# Altium footprint library 集成IC.PcbLib: 49 footprints (part 2 of 4)
Each footprint in its own frame and in the unit in brackets; x right, y up, seen from the top. Pads: shape width x height; smd on the part's side, far side on the other; paste and mask are expansions set on the pad; w line width, h text height; cw(c..) or ccw(c..) is an arc to the next point about the centre after c.
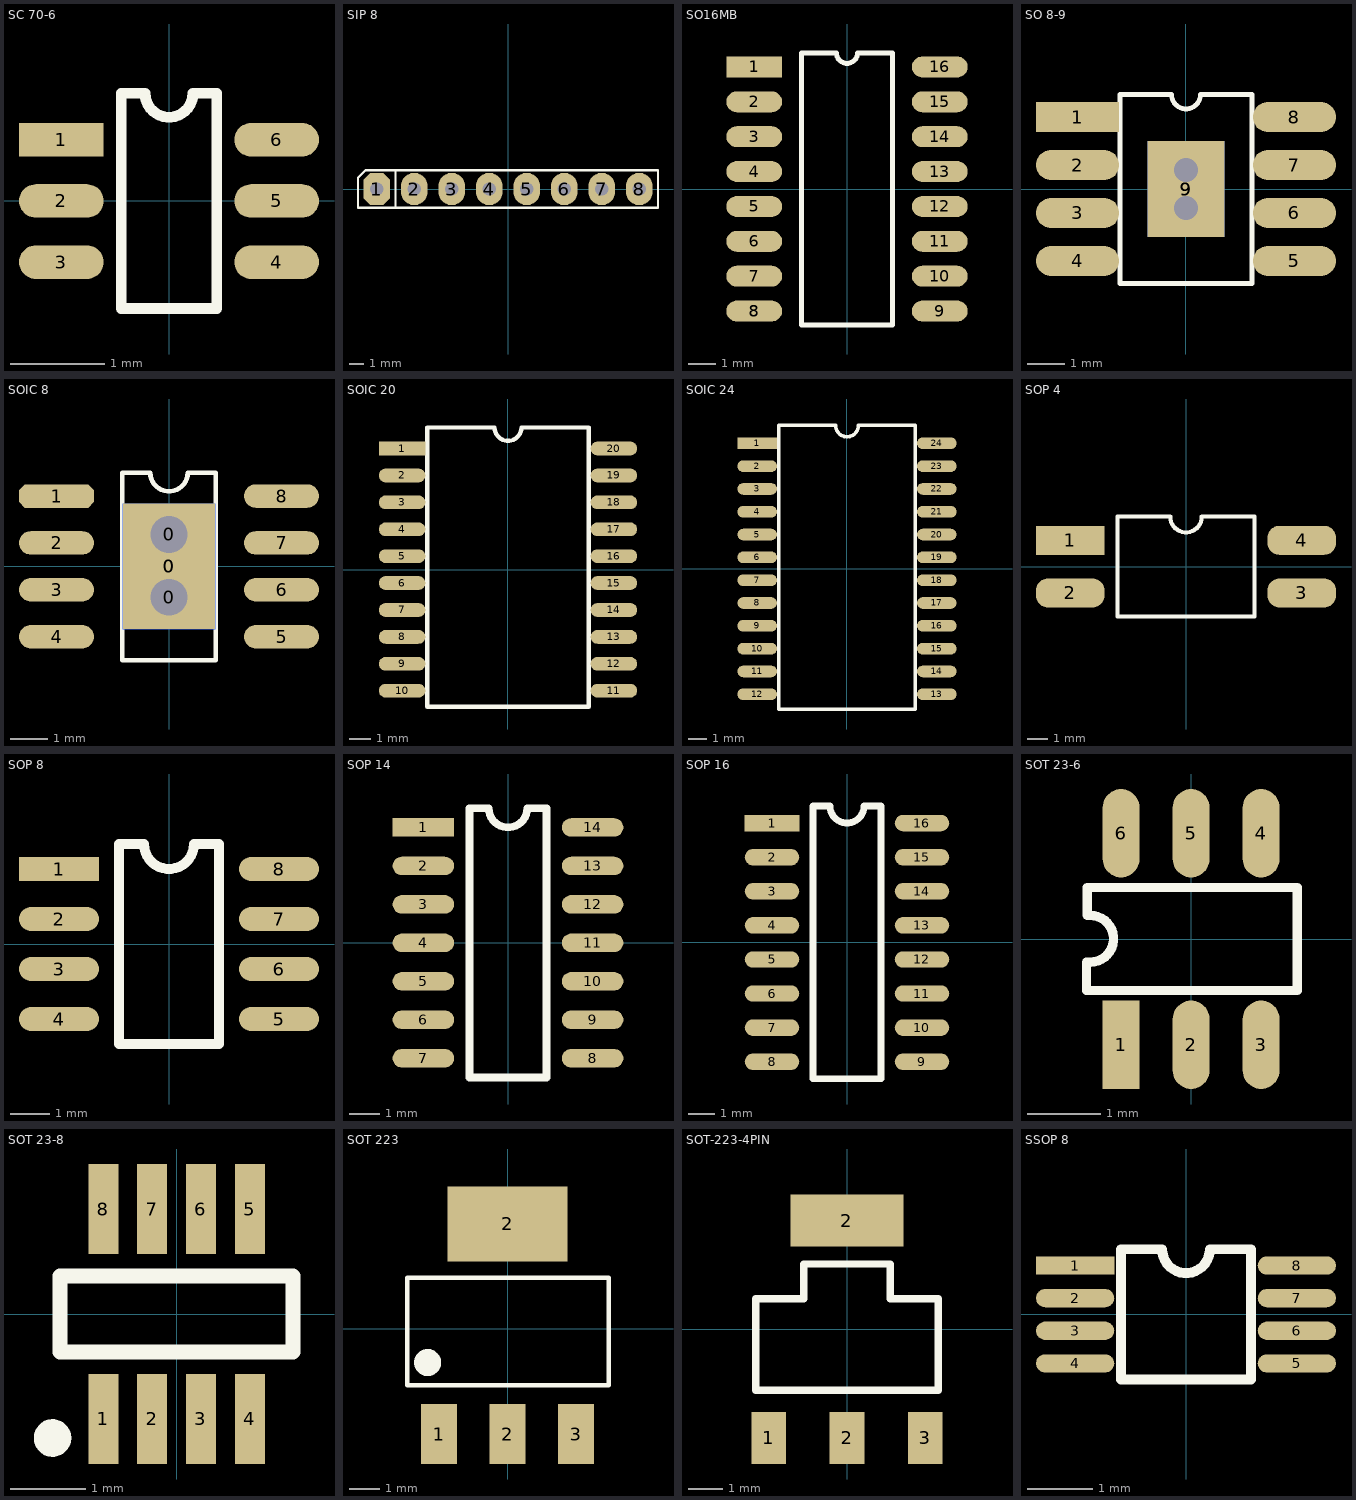
[diagram p1: the footprints below, top view; thin cyan lines are the x and y axes]

## SC 70-6 [mil] "SGM4157    SGM3157"
height 35.43
pads (6):
  rect 35.43x14 smd: 1(-45,25.59)
  oval 35.43x14 smd: 2(-45,0) 3(-45,-25.59) 4(45,-25.59) 5(45,0) 6(45,25.59)
Top Overlay:
  lines w4.5: -20,-45 -20,45 -10,45 ccw(c0,45) 10,45 20,45 20,-45 -20,-45
3D body: height 35.43, standoff 0, extent -44.29,-39.74 44.29,39

## SIP 8 [mm]
pads (8):
  oct 1.8x2.2 hole 0.9: 1(-8.89,0)
  oval 1.8x2.2 hole 0.9: 2(-6.35,0) 3(-3.81,0) 4(-1.27,0) 5(1.27,0) 6(3.81,0) 7(6.35,0) 8(8.89,0)
Top Overlay:
  lines w0.152: -7.62,-1.27 -7.62,1.27 ; -10.16,-1.27 10.16,-1.27 10.16,1.27 -9.652,1.27 -10.16,0.762 -10.16,-1.27
3D body: height 10.53, standoff -1.27, extent -9.65,-1.628 9.65,1.622

## SO16MB [mil]
pads (17):
  rect 80x30 smd: 1(-133,175)
  oval 80x30 smd: 2(-133,125) 3(-133,75) 4(-133,25) 5(-133,-25) 6(-133,-75) 7(-133,-125) 8(-133,-175) 8(-133,-175) 9(133,-175) 10(133,-125) 11(133,-75) 12(133,-25) 13(133,25) 14(133,75) 15(133,125) 16(133,175)
Top Overlay:
  lines w7: -65,-195 -65,195 -15,195 ccw(c0,195) 15,195 65,195 65,-195 -65,-195
3D body: height 68.9, standoff 0, extent -118.12,-196.84 118.1,196.86

## SO 8-9 [mm]
pads (11):
  rect 2.2x0.8 smd: 1(-2.87,1.905)
  oval 2.2x0.8 smd: 2(-2.87,0.635) 3(-2.87,-0.635) 4(-2.87,-1.905) 5(2.87,-1.905) 6(2.87,-0.635) 7(2.87,0.635) 8(2.87,1.905)
  rect 2.032x2.54 smd: 9(0,0)
  rect 2.032x2.54 on Bottom Paste: 9(0,0)
  rect 2.032x2.54 smd far side: 9(0,0)
via 0,-0.508 diameter 0.889 hole 0.635
via 0,0.508 diameter 0.889 hole 0.635
Top Overlay:
  lines w0.127: -1.746,-2.5 -1.746,2.5 -0.381,2.5 ccw(c0,2.5) 0.381,2.5 1.746,2.5 1.746,-2.5 -1.746,-2.5
3D body: height 3.33, standoff -0.4, extent -2.997,-2.525 3.008,2.475

## SOIC 8 [mil]
pads (12):
  oval 70.87x59.06 hole 39.37: 0(0,-33) 0(0,34)
  rect 98.43x133.86 smd: 0(0,0)
  rect 98.43x133.86 smd far side: 0(0,0)
  oct 80x25 smd: 1(-120,75)
  oval 80x25 smd: 2(-120,25) 3(-120,-25) 4(-120,-75) 5(120,-75) 6(120,-25) 7(120,25) 8(120,75)
Top Overlay:
  lines w5: -50,-100 50,-100 50,100 20,100 cw(c0,100) -20,100 -50,100 -50,-100
3D body: height 131.12, standoff -15.9, extent -118.22,-98.85 118.22,98

## SOIC 20 [mm]
pads (20):
  rect 2.2x0.65 smd: 1(-5,5.715)
  oval 2.2x0.65 smd: 2(-5,4.445) 3(-5,3.175) 4(-5,1.905) 5(-5,0.635) 6(-5,-0.635) 7(-5,-1.905) 8(-5,-3.175) 9(-5,-4.445) 10(-5,-5.715) 11(5,-5.715) 12(5,-4.445) 13(5,-3.175) 14(5,-1.905) 15(5,-0.635) 16(5,0.635) 17(5,1.905) 18(5,3.175) 19(5,4.445) 20(5,5.715)
Top Overlay:
  lines w0.2: -3.81,-6.477 3.81,-6.477 3.81,6.096 3.81,6.711 0.635,6.711 cw(c0,6.711) -0.635,6.711 -3.81,6.711 -3.81,6.096 -3.81,-6.477
3D body: height 2.19, standoff -0.05, extent -5.067,-6.3 5.067,6.3

## SOIC 24 [mm]
pads (24):
  rect 2.2x0.65 smd: 1(-5,6.985)
  oval 2.2x0.65 smd: 2(-5,5.715) 3(-5,4.445) 4(-5,3.175) 5(-5,1.905) 6(-5,0.635) 7(-5,-0.635) 8(-5,-1.905) 9(-5,-3.175) 10(-5,-4.445) 11(-5,-5.715) 12(-5,-6.985) 13(5,-6.985) 14(5,-5.715) 15(5,-4.445) 16(5,-3.175) 17(5,-1.905) 18(5,-0.635) 19(5,0.635) 20(5,1.905) 21(5,3.175) 22(5,4.445) 23(5,5.715) 24(5,6.985)
Top Overlay:
  lines w0.2: -3.81,-7.829 -3.81,-7.214 -3.81,7.366 -3.81,7.981 -0.635,7.981 ccw(c0,7.981) 0.635,7.981 3.81,7.981 3.81,7.366 3.81,-7.214 3.81,-7.829 -3.81,-7.829
3D body: height 2.6, standoff 0, extent -5.74,-7.852 4.66,7.548

## SOP 4 [mil]
pads (4):
  rect 130x55 smd: 1(-220,49.99)
  rrect80% 130x55 smd: 2(-220,-50.01) 3(220,-50.01) 4(220,49.99)
Top Overlay:
  lines w8: -130,-95.01 -130,94.99 -30,94.99 ccw(c0,94.99) 30,94.99 130,94.99 130,-95.01 -130,-95.01
3D body: height 83.37, standoff -0.09, extent -200.79,-80.72 200.78,80.7

## SOP 8 [mil]
pads (8):
  rect 80x24 smd: 1(-110,75)
  oval 80x24 smd: 2(-110,25) 3(-110,-25) 4(-110,-75) 5(110,-75) 6(110,-25) 7(110,25) 8(110,75)
Top Overlay:
  lines w10: -50,-100 -50,100 -25,100 ccw(c0,100) 25,100 50,100 50,-100 -50,-100
3D body: height 74.8, standoff 0.03, extent -118.21,-98.42 118.23,98.43

## SOP 14 [mil]
pads (14):
  rect 80x24 smd: 1(-110,150)
  oval 80x24 smd: 2(-110,100) 3(-110,50) 4(-110,0) 5(-110,-50) 6(-110,-100) 7(-110,-150) 8(110,-150) 9(110,-100) 10(110,-50) 11(110,0) 12(110,50) 13(110,100) 14(110,150)
Top Overlay:
  lines w10: -50,-175 50,-175 50,175 25,175 cw(c0,175) -25,175 -50,175 -50,-175
3D body: height 74.8, standoff 0.03, extent -118.21,-171.26 118.23,171.26

## SOP 16 [mil]
pads (16):
  rect 80x24 smd: 1(-110,175)
  oval 80x24 smd: 2(-110,125) 3(-110,75) 4(-110,25) 5(-110,-25) 6(-110,-75) 7(-110,-125) 8(-110,-175) 9(110,-175) 10(110,-125) 11(110,-75) 12(110,-25) 13(110,25) 14(110,75) 15(110,125) 16(110,175)
Top Overlay:
  lines w3: -50,-200 50,-200
  lines w10: -50,-200 50,-200 50,200 25,200 cw(c0,200) -25,200 -50,200 -50,-200
3D body: height 74.8, standoff 0.03, extent -118.21,-196.85 118.23,196.85

## SOT 23-6 [mm]
pads (6):
  rect 0.5x1.2 smd: 1(-0.95,-1.435)
  oval 0.5x1.2 smd: 2(0,-1.435) 3(0.95,-1.435) 4(0.95,1.435) 5(0,1.435) 6(-0.95,1.435)
Top Overlay:
  lines w0.127: -1.306,-0.699 1.44,-0.699 1.44,0.699 -1.41,0.699 -1.41,0.321 -1.37,0.321 cw(c-1.37,0.003) -1.37,-0.315 -1.42,-0.315 -1.42,-0.699 -0.73,-0.699
3D body: height 1.15, standoff -0.03, extent -1.5,-1.403 1.5,1.404

## SOT 23-8 [mm] "3x1.6x1.1mm(长宽高)"
height 1.45
pads (8):
  rect 0.4x1.2 smd: 1(-0.975,-1.397) 2(-0.325,-1.397) 3(0.325,-1.397) 4(0.975,-1.397) 5(0.975,1.397) 6(0.325,1.397) 7(-0.325,1.397) 8(-0.975,1.397)
Top Overlay:
  circle w0.25: c-1.651,-1.651 r0.125
  lines w0.2: -1.55,-0.508 1.55,-0.508 1.55,0.508 -1.55,0.508 -1.55,-0.508
3D body: height 1.15, standoff 0, extent -1.5,-1.403 1.5,1.403

## SOT 223 [mm]
pads (4):
  rect 1.2x2 smd: 1(-2.286,-3.5) 2(0,-3.5) 3(2.286,-3.5)
  rect 4x2.5 smd: 2(0,3.5)
Top Overlay:
  circle w0.5: c-2.664,-1.118 r0.2
  lines w0.15: -3.353,-1.88 3.378,-1.88 3.378,1.702 -3.353,1.702 -3.353,-1.88
3D body: height 1.65, standoff -0.02, extent -3.25,-3.635 3.25,3.381

## SOT-223-4PIN [mil] "电源降压  5V降至3.3V"
pads (4):
  rect 40x60 smd: 1(-90,-125) 2(0,-125) 3(90,-125)
  rect 130x60 smd: 2(0,125)
Top Overlay:
  lines w8.6: -105,-70 -105,35 -50,35 -50,75 50,75 50,35 105,35 105,-70 -105,-70
3D body: height 65.04, standoff 0.08, extent -127.94,-137.79 127.96,137.8

## SSOP 8 [mm]
pads (8):
  rect 1.2x0.28 smd: 1(-1.7,0.75)
  oval 1.2x0.28 smd: 2(-1.7,0.25) 3(-1.7,-0.25) 4(-1.7,-0.75) 5(1.7,-0.75) 6(1.7,-0.25) 7(1.7,0.25) 8(1.7,0.75)
Top Overlay:
  lines w0.152: -1,-1 -1,1 -0.365,1 ccw(c0,1) 0.365,1 1,1 1,-1 -1,-1
3D body: height 0.74, standoff -0.01, extent -1.55,-0.975 1.55,1.025